# Altium footprint library PCBLIB.PcbLib: 775 footprints (part 4 of 49)
Each footprint in its own frame and in the unit in brackets; x right, y up, seen from the top. Pads: shape width x height; smd on the part's side, far side on the other; paste and mask are expansions set on the pad; w line width, h text height; cw(c..) or ccw(c..) is an arc to the next point about the centre after c.
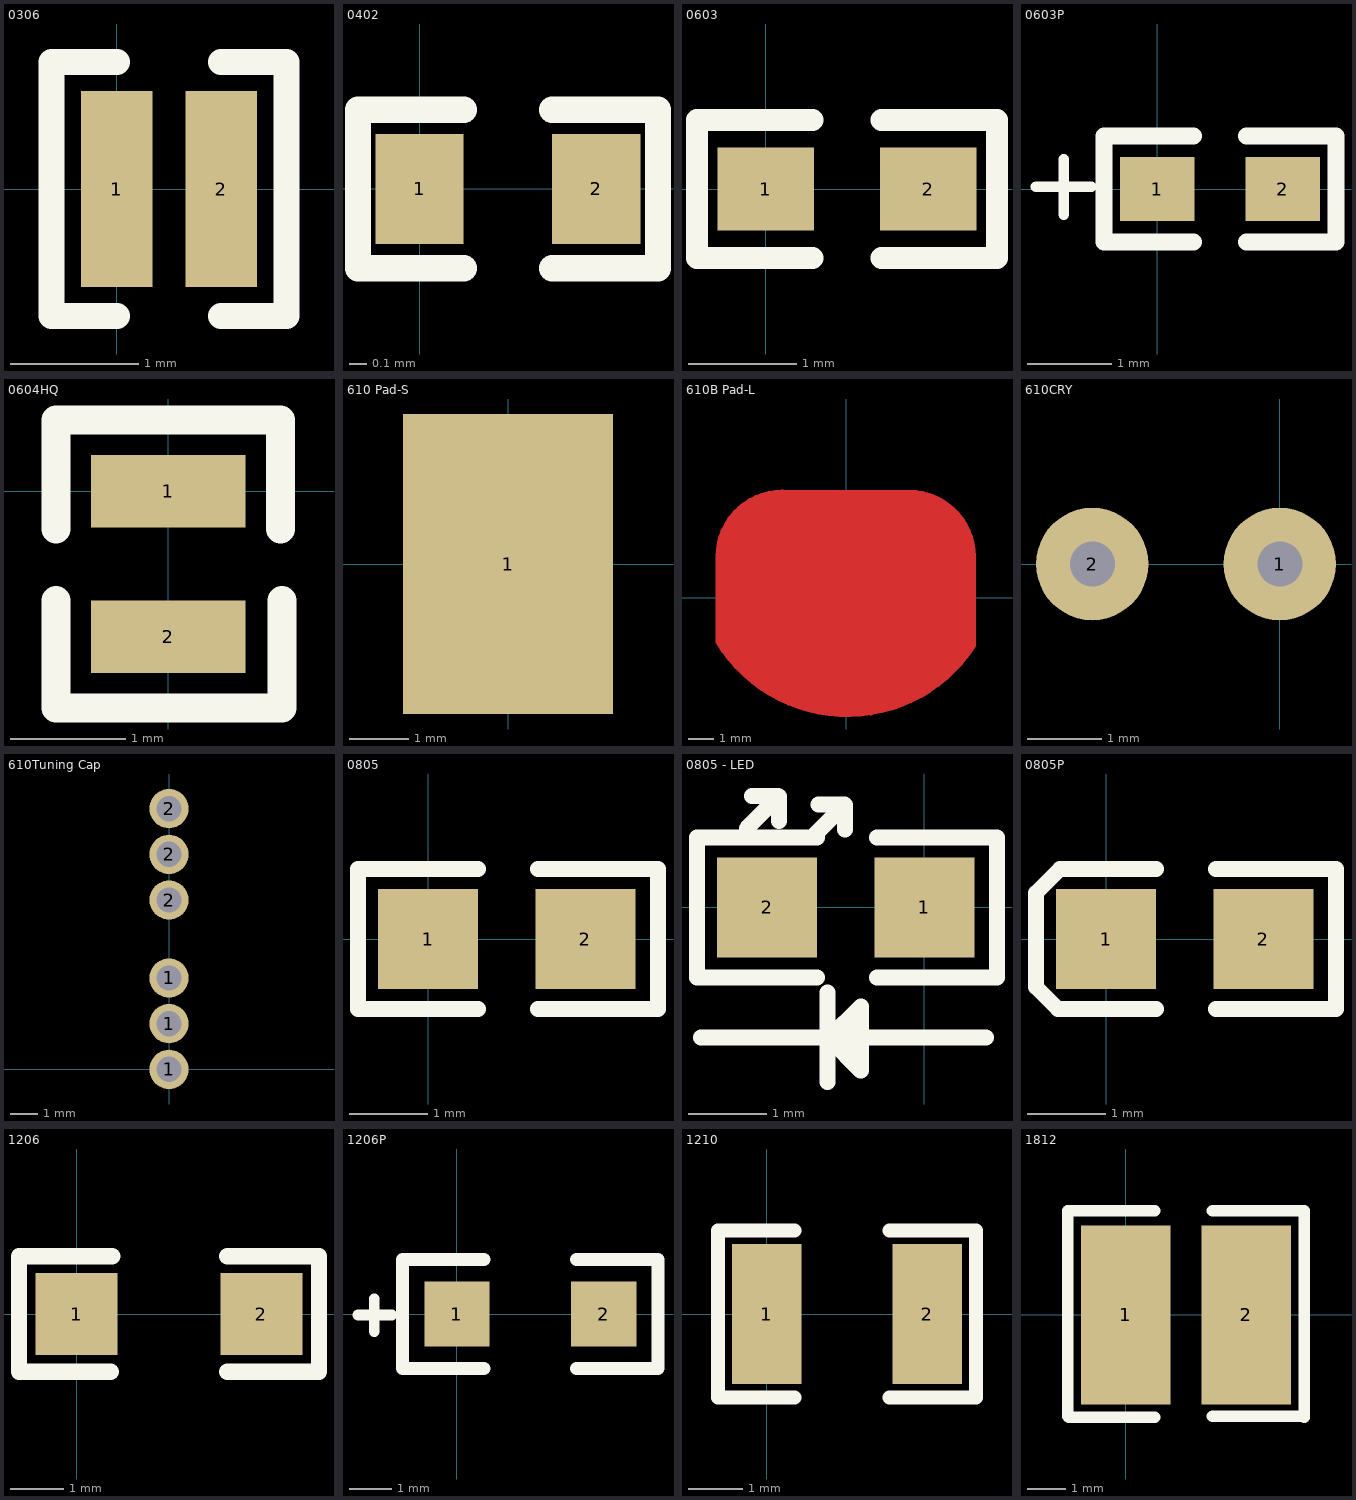
[diagram p3: the footprints below, top view; thin cyan lines are the x and y axes]

## 0306 [mil]
height 25
pads (2):
  rect 22x60 smd: 1(0,0) 2(32,0)
TopOverlay:
  lines w8: 0,-39 -20,-39 -20,39 0,39 ; 32,-39 52,-39 52,39 32,39
Mechanical4:
  text "0.0311" at 2,0 h1

## 0402 [mil]
height 15
pads (2):
  rect 20x25 smd: 1(0,0) 2(40.11,0)
TopOverlay:
  lines w6: 10,-18.01 -14,-18.01 -14,17.99 10,17.99 ; 30.12,-18.01 54.12,-18.01 54.12,17.99 30.12,17.99
Mechanical4:
  text "0.0311" at 2,-0.01 h1
3D body: height 11.81, standoff 0, extent 0.32,-9.84 39.69,9.85

## 0603 [mil]
height 25
pads (2):
  rect 35x30 smd: 1(0,0) 2(59,0)
TopOverlay:
  lines w8: 17,-25 -25,-25 -25,25 17,25 ; 42,-25 84,-25 84,25 42,25
Mechanical4:
  text "0.0311" at 2,0 h1

## 0603P [mil] "Polarized 0603"
height 25
pads (2):
  rect 35x30 smd: 1(0,0) 2(59,0)
TopOverlay:
  lines w5: -57,1 -31,1 ; -44,-12 -44,14
  lines w8: 17,-25 -25,-25 -25,25 17,25 ; 42,-25 84,-25 84,25 42,25
Mechanical4:
  text "0.0311" at 2,0 h1

## 0604HQ [mil]
pads (2):
  rect 53x25 smd: 1(0,0) 2(0,-50)
TopOverlay:
  lines w10: -38.5,-37.5 -38.5,-74.5 39,-74.5 39,-37.5 ; -38.5,-13 -38.5,24.5 38.5,24.5 38.5,-13

## 610 Pad-S [mil]
height 5
pads (1):
  rect 140x200 smd: 1(0,0)

## 610B Pad-L [mil]
TopLayer:
  lines w10: -201,-69.32 -201,64.99 cw(c-101,64.99) -101,164.99 99,164.67 cw(c99,64.67) 199,65 199,-75.15 ; -200.88,-69.32 ccw(c1,53) 199.23,-75.15
  lines w40: -163,-93 -157,-99 -139,-99 ; -28,-10 41,-10 ; 29,149 22,142 -125,142 -133,142 -173,102 -179,96 -179,-65 -179,-67 -112,-134 -97,-134 -82,-149 -79,-152 -62,-152 -54,-160 -50,-160 54,-160 64,-150 78,-150 86,-150 96,-140 105,-140 111,-134 115,-134 178,-71 178,89 169,98 169,103 138,134 129,143 40,143 6,109 -124,109 -146,87 -146,79 -143,76 -143,-66 -84,-125 -56,-125 62,-125 76,-111 111,-111 143,-79 143,89 128,104 39,104 8,73 8,72 5,75 -118,75 -106,63 -106,-67 -75,-98 -69,-98 -60,-89 55,-89 66,-78 109,-78 109,75 108,74 52,74 22,44 22,42 -73,42 -69,38 -69,-67 -63,-61 52,-61 64,-49 87,-49 76,-38 76,50 51,25 49,25 34,10 -39,10 -34,5 -34,-39 -25,-30 49,-30 50,-29 50,-7

## 610CRY [mil]
height 10
pads (2):
  round 60 hole 24: 1(0,0) 2(-100,0)

## 610Tuning Cap [mil]
height 5
pads (6):
  round 56 hole 36: 1(0,0) 1(0,65) 1(0,130) 2(0,241) 2(0,306) 2(0,371)

## 0805 [mm]
height 0.813
pads (2):
  rect 1.27x1.27 smd: 1(0,0) 2(2,0)
TopOverlay:
  lines w0.203: 0.635,-0.889 -0.889,-0.889 -0.889,0.889 0.635,0.889 ; 1.397,-0.889 2.921,-0.889 2.921,0.889 1.397,0.889

## 0805 - LED [mm]
height 0.889
pads (2):
  rect 1.27x1.27 smd: 1(0,0) 2(-2,0)
TopOverlay:
  lines w0.203: -2.839,-1.651 0.78,-1.65 ; -2.257,1.003 -1.851,1.41 ; -2.189,1.415 -1.859,1.415 ; -1.848,1.101 -1.848,1.405 ; -1.418,0.896 -1.012,1.303 ; -1.365,-0.889 -2.889,-0.889 -2.889,0.889 -1.365,0.889 ; -1.345,1.31 -1.015,1.31 ; -1.232,-2.217 -1.232,-1.078 ; -1.212,-1.67 -0.81,-2.072 ; -1.208,-1.657 -0.806,-1.257 -0.806,-2.068 ; -1.009,0.99 -1.009,1.295 ; -0.948,-1.53 -0.806,-1.53 ; -0.929,-1.739 -0.929,-1.651 ; -0.603,-0.889 0.921,-0.889 0.921,0.889 -0.603,0.889

## 0805P [mm]
height 0.889
pads (2):
  rect 1.27x1.27 smd: 1(0,0) 2(2,0)
TopOverlay:
  lines w0.203: 0.635,-0.889 -0.61,-0.889 -0.889,-0.61 -0.889,0.584 -0.584,0.889 0.635,0.889 ; 1.397,-0.889 2.921,-0.889 2.921,0.889 1.397,0.889

## 1206 [mil]
height 40
pads (2):
  rect 60x60 smd: 1(0,0) 2(135,0)
TopOverlay:
  lines w12: 25,-42 -42,-42 -42,42 26,42 ; 110,-42 177,-42 177,42 110,42
Mechanical4:
  text ".045" at 0,0 h1

## 1206P [mil]
height 50
pads (2):
  rect 60x60 smd: 1(0,0) 2(135,0)
TopOverlay:
  lines w10: -91,-1 -76,-1 -60,-1 ; -76,-16 -76,14
  lines w12: 25,-50 -50,-50 -50,50 25,50 ; 110,-50 185,-50 185,50 110,50
Mechanical4:
  text ".045" at 0,0 h1

## 1210 [mil]
height 60
pads (2):
  rect 50x100 smd: 1(0,0) 2(115,0)
TopOverlay:
  lines w10: 20,-60 -35,-60 -35,60 20,60 ; 88,-60 150,-60 150,60 88,60
Mechanical4:
  text ".065" at 0,0 h1

## 1812 [mil]
pads (2):
  rect 93x186 smd: 1(0,0) 2(125,0)
TopOverlay:
  lines w12: 30,-106 -59,-106 -60,-105 -60,108 30,108 ; 90,-105 184,-105 185,-106 185,108 90,108
Mechanical4:
  text ".065" at 0,0 h1